# Altium footprint library PcbLib_Discrete_ThroughHole.PcbLib: 104 footprints (part 2 of 7)
Each footprint in its own frame and in the unit in brackets; x right, y up, seen from the top. Pads: shape width x height; smd on the part's side, far side on the other; paste and mask are expansions set on the pad; w line width, h text height; cw(c..) or ccw(c..) is an arc to the next point about the centre after c.
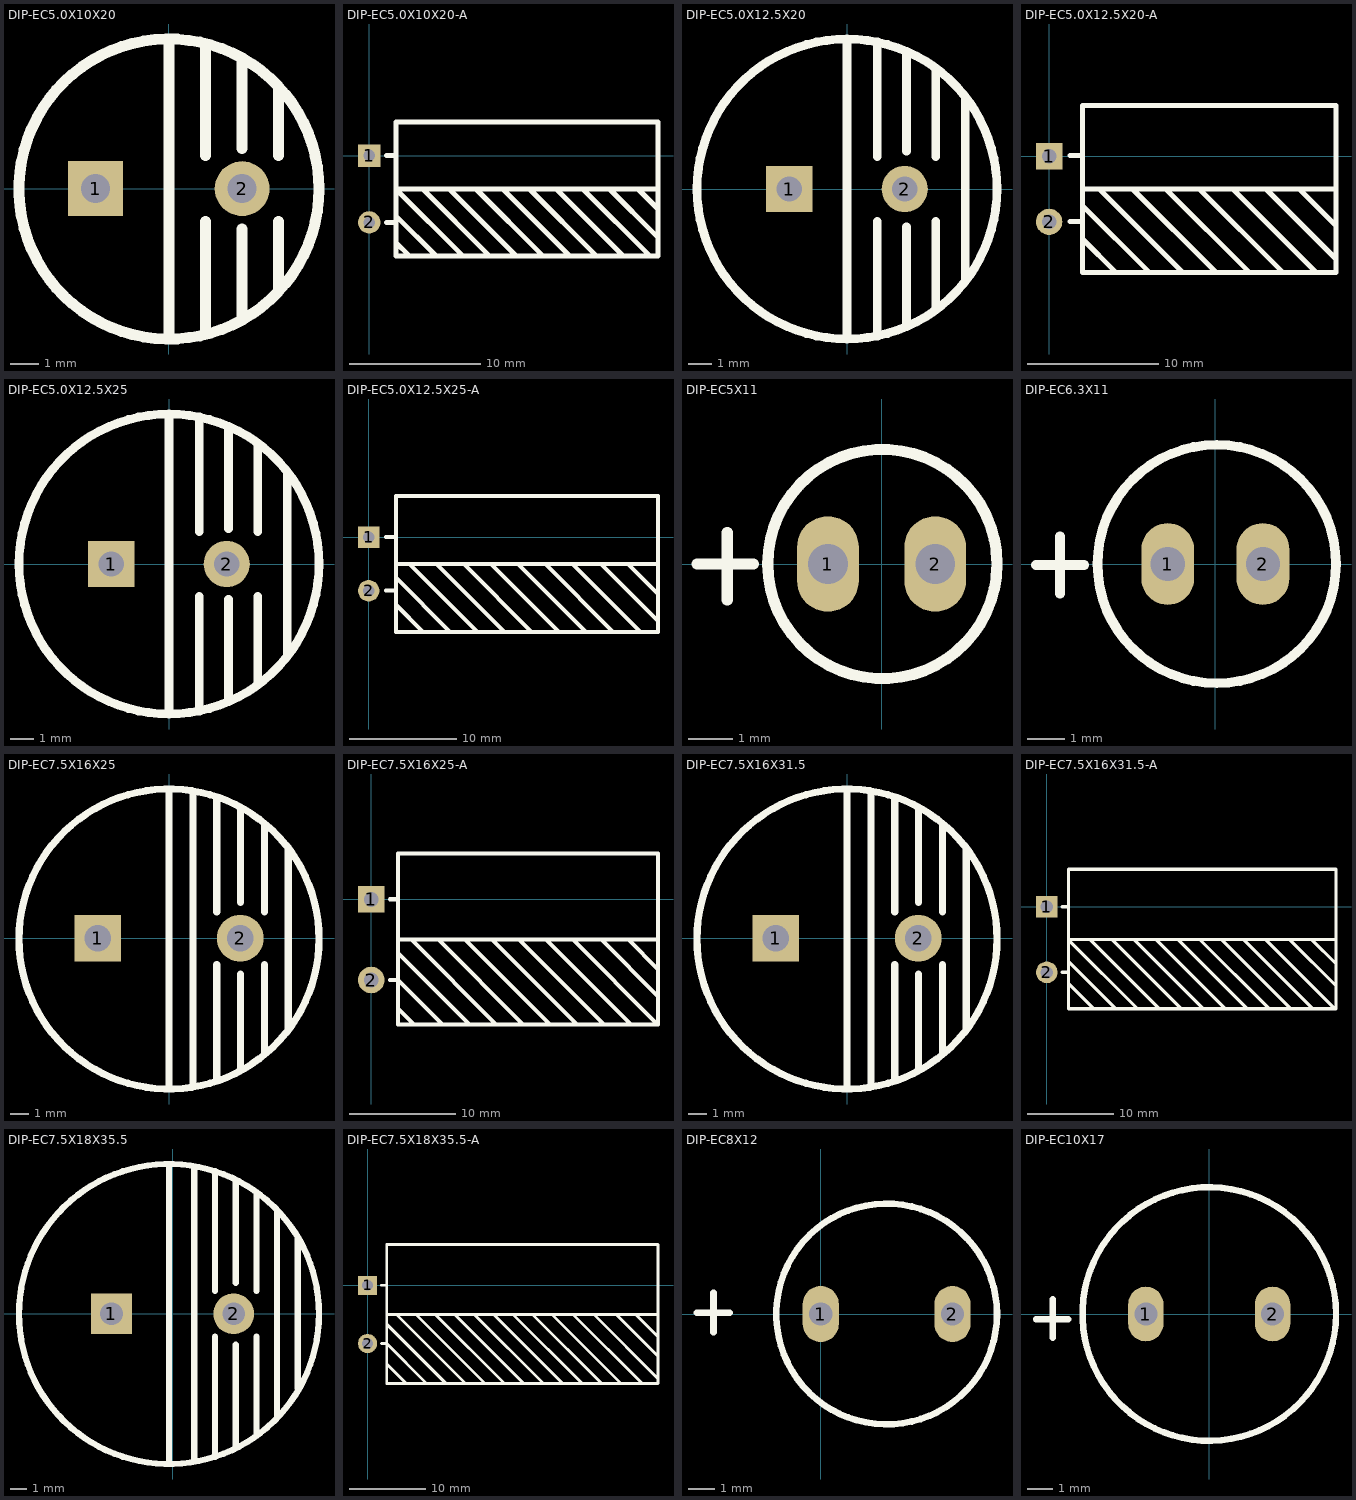
[diagram p1: the footprints below, top view; thin cyan lines are the x and y axes]

## DIP-EC5.0X10X20 [mm]
pads (2):
  rect 1.9x1.9 hole 1: 1(-2.54,0)
  round 1.9 hole 1: 2(2.54,0)
Top Overlay:
  circle w0.381: c0.006,-0.013 r5.2
  lines w0.381: 0.006,-5.197 0.006,5.072 ; 0.006,-5.082 0.006,-5.075 ; 0.006,-4.07 0.006,-4.064 ; 0.006,-3.054 0.006,-3.05 0.006,-3.043 ; 0.006,-2.032 0.006,-2.038 ; 0.006,2.026 0.006,2.032 ; 0.006,4.058 0.006,4.064 ; 0.006,5.074 0.006,5.187 ; 1.27,-4.953 1.27,-1.143 ; 1.27,1.143 1.27,4.953 ; 2.54,-4.445 2.54,-1.397 ; 2.54,1.397 2.54,4.445 ; 3.81,-3.429 3.81,-1.143 ; 3.81,1.143 3.81,3.429 ; 0.006,-2.038 0.006,-2.038
3D body "CAP 5.0X10X20.STEP": height 20.03, standoff -3.38, extent -4.999,-5.062 5.011,4.938

## DIP-EC5.0X10X20-A [mm]
pads (2):
  rect 1.7x1.7 hole 0.9: 1(0,0)
  round 1.7 hole 0.9: 2(0,-5.08)
Top Overlay:
  lines w0.381: 1.321,-5.08 1.778,-5.08 2.032,-5.08 ; 1.321,0 1.778,0 2.032,0 ; 2.032,-6.604 3.048,-7.62 ; 2.032,-4.572 5.08,-7.62 ; 3.81,-2.54 21.971,-2.54 ; 6.096,-2.54 11.176,-7.62 ; 7.112,-7.62 2.032,-2.54 ; 8.128,-2.54 13.208,-7.62 ; 9.144,-7.62 4.064,-2.54 2.54,-2.54 2.032,-2.54 ; 9.652,-2.54 10.16,-2.54 15.24,-7.62 ; 12.192,-2.54 17.272,-7.62 ; 14.224,-2.54 19.304,-7.62 ; 16.256,-2.54 21.336,-7.62 ; 18.288,-2.54 21.844,-6.096 ; 20.32,-2.54 20.447,-2.54 21.971,-4.064 ; 2.032,-2.54 2.032,-2.54 ; 2.032,-7.62 21.971,-7.62 21.971,2.54 2.032,2.54 2.032,-7.62
3D body "CAP 5.0X10X20-H.STEP": height 10.03, standoff -3.47, extent -0.254,-7.545 21.956,2.465

## DIP-EC5.0X12.5X20 [mm]
pads (2):
  rect 2x2 hole 1.1: 1(-2.5,0)
  round 2 hole 1.1: 2(2.5,0)
Top Overlay:
  circle w0.381: c0,0 r6.5
  lines w0.381: 0,-5.842 0,-6.35 0,6.35 ; 0,-5.08 0,-3.81 ; 0,-2.54 0,-1.778 ; 0,1.016 0,2.286 ; 0,3.048 0,4.064 ; 1.31,-6.35 1.31,-1.397 ; 1.31,1.397 1.31,6.35 ; 2.58,-5.842 2.58,-1.651 ; 2.58,1.651 2.58,5.842 ; 3.85,-5.207 3.85,-1.397 ; 3.85,1.397 3.85,5.207 ; 5.12,-3.937 5.12,3.937
3D body "CAP 5.0X12.5X20.STEP": height 20.03, standoff -3.38, extent -6.255,-6.25 6.255,6.25

## DIP-EC5.0X12.5X20-A [mm]
pads (2):
  rect 2x2 hole 1.1: 1(0,0)
  round 2 hole 1.1: 2(0,-5)
Top Overlay:
  lines w0.381: 1.6,-4.96 2.54,-4.96 ; 1.6,0.04 2.54,0.04 ; 2.54,-6.31 5.08,-8.85 ; 2.54,-3.77 7.62,-8.85 ; 2.54,-2.5 21.844,-2.5 ; 3.81,-2.5 10.16,-8.85 ; 6.35,-2.5 12.7,-8.85 ; 8.89,-2.5 15.24,-8.85 ; 11.43,-2.5 17.78,-8.85 ; 13.97,-2.5 20.32,-8.85 ; 16.51,-2.5 21.844,-7.834 ; 19.05,-2.5 21.844,-5.294 ; 2.54,-8.85 2.54,3.85 21.844,3.85 21.844,-8.85 2.54,-8.85
3D body "CAP 5.0X12.5X20-H.STEP": height 12.53, standoff -3.47, extent -0.381,-8.668 21.829,3.842

## DIP-EC5.0X12.5X25 [mm]
pads (2):
  rect 2x2 hole 1.1: 1(-2.5,0)
  round 2 hole 1.1: 2(2.5,0)
Top Overlay:
  circle w0.381: c0,0 r6.5
  lines w0.381: 0,-5.842 0,-6.35 0,6.35 ; 0,-5.08 0,-3.81 ; 0,-2.54 0,-1.778 ; 0,1.016 0,2.286 ; 1.31,-6.35 1.31,-1.397 ; 1.31,1.397 1.31,6.35 ; 2.58,-5.842 2.58,-1.524 ; 2.58,1.524 2.58,5.842 ; 3.85,-5.207 3.85,-1.397 ; 3.85,1.397 3.85,5.207 ; 5.12,-3.937 5.12,3.937
3D body "CAP 5.0X12.5X25.STEP": height 25.04, standoff -3.37, extent -6.255,-6.248 6.255,6.248

## DIP-EC5.0X12.5X25-A [mm]
pads (2):
  rect 2x2 hole 1.1: 1(0,0)
  round 2 hole 1.1: 2(0,-5)
Top Overlay:
  lines w0.381: 1.6,-4.96 2.54,-4.96 ; 1.6,0.04 2.54,0.04 ; 2.54,-6.31 5.08,-8.85 ; 2.54,-3.77 7.62,-8.85 ; 2.54,-2.5 27.051,-2.5 ; 3.81,-2.5 10.16,-8.85 ; 6.35,-2.5 12.7,-8.85 ; 8.89,-2.5 15.24,-8.85 ; 11.43,-2.5 17.78,-8.85 ; 13.97,-2.5 20.32,-8.85 ; 16.51,-2.5 22.86,-8.85 ; 19.05,-2.5 25.4,-8.85 ; 21.717,-2.5 27.051,-7.834 ; 24.257,-2.5 27.051,-5.294 ; 2.54,-8.85 27.051,-8.85 27.051,3.85 2.54,3.85 2.54,-8.85
3D body "CAP 5.0X12.5X25-H.STEP": height 12.53, standoff -3.47, extent -0.381,-8.795 26.829,3.715

## DIP-EC5X11 [mil]
pads (2):
  oval 55x85 hole 35.43: 1(-47.75,0) 2(47.75,0)
Top Overlay:
  circle w10: c0.75,0 r102.02
  lines w10: -164.25,0 -114.25,0 ; -137.25,-32 -137.25,28
3D body "CAP_5×11.STEP": height 491.5, standoff -158.11, extent -107.52,-108.24 109.02,108.24

## DIP-EC6.3X11 [mil]
pads (2):
  oval 55x85 hole 35.43: 1(-49.5,0) 2(49.5,0)
Top Overlay:
  circle w10: c1.5,0 r124.02
  lines w10: -186.5,-1 -136.5,-1 ; -161.5,-31 -161.5,29
3D body "Cap_D63H110.STEP": height 492.13, standoff -118.11, extent -131.36,-133.45 135.21,133.45

## DIP-EC7.5X16X25 [mm]
pads (2):
  rect 2.5x2.5 hole 1.4: 1(-3.8,0)
  round 2.5 hole 1.4: 2(3.8,0)
Top Overlay:
  circle w0.381: c0,-0.038 r8
  lines w0.381: 0,-8.001 0,7.925 ; 1.28,-7.874 1.28,7.747 ; 2.55,-7.493 2.55,-1.397 ; 2.55,1.397 2.55,7.493 ; 3.82,-6.985 3.82,-1.905 ; 3.82,1.905 3.82,6.985 ; 5.09,-6.096 5.09,-1.397 ; 5.09,1.397 5.09,6.096 ; 6.36,-4.826 6.36,4.826
3D body "CAP 7.5X16X25.STEP": height 25.03, standoff -3.38, extent -8.005,-7.998 8.005,7.998

## DIP-EC7.5X16X25-A [mm]
pads (2):
  rect 2.5x2.5 hole 1.4: 1(0,0)
  round 2.5 hole 1.4: 2(0,-7.6)
Top Overlay:
  lines w0.381: 1.778,-7.59 2.502,-7.59 ; 1.778,0.01 2.502,0.01 ; 2.502,-10.277 4.026,-11.801 ; 2.502,-7.61 6.693,-11.801 ; 2.502,-5.07 9.233,-11.801 ; 2.502,-3.8 27.013,-3.8 ; 3.772,-3.8 11.773,-11.801 ; 6.312,-3.8 14.313,-11.801 ; 8.852,-3.8 16.853,-11.801 ; 11.392,-3.8 19.393,-11.801 ; 13.932,-3.8 21.869,-11.738 ; 16.472,-3.8 24.409,-11.738 ; 19.012,-3.8 26.941,-11.729 ; 21.679,-3.8 27.013,-9.134 ; 24.219,-3.8 27.013,-6.594 ; 2.502,-11.801 2.502,4.328 27.013,4.328 27.013,-11.801 2.502,-11.801
3D body "CAP 7.5X16X25-H.STEP": height 16.03, standoff -3.47, extent -0.508,-11.688 26.902,4.322

## DIP-EC7.5X16X31.5 [mm]
pads (2):
  rect 2.5x2.5 hole 1.4: 1(-3.8,0)
  round 2.5 hole 1.4: 2(3.8,0)
Top Overlay:
  circle w0.381: c0,-0.038 r8
  lines w0.381: 0,-8.001 0,7.925 ; 1.28,-7.874 1.28,7.747 ; 2.55,-7.62 2.55,-1.397 ; 2.55,1.397 2.55,7.493 ; 3.82,-6.985 3.82,-1.905 ; 3.82,1.905 3.82,6.985 ; 5.09,-6.096 5.09,-1.397 ; 5.09,1.397 5.09,6.096 ; 6.36,-4.826 6.36,4.699
3D body "CAP 7.5X16X31.5.STEP": height 31.53, standoff -3.38, extent -8.005,-7.999 8.005,7.999

## DIP-EC7.5X16X31.5-A [mm]
pads (2):
  rect 2.5x2.5 hole 1.4: 1(0,0)
  round 2.5 hole 1.4: 2(0,-7.6)
Top Overlay:
  lines w0.381: 1.778,-7.59 2.502,-7.59 ; 1.778,0.01 2.502,0.01 ; 2.502,-8.88 5.423,-11.801 ; 2.502,-6.34 7.963,-11.801 ; 5.042,-3.8 13.043,-11.801 ; 7.582,-3.8 15.519,-11.738 ; 10.122,-3.8 18.059,-11.738 ; 10.503,-11.801 2.502,-3.8 33.49,-3.8 ; 12.662,-3.8 20.599,-11.738 ; 15.202,-3.8 23.139,-11.738 ; 17.742,-3.8 25.679,-11.738 ; 20.282,-3.8 28.219,-11.738 ; 22.822,-3.8 30.759,-11.738 ; 25.362,-3.8 33.291,-11.729 ; 28.156,-3.8 33.49,-9.134 ; 30.696,-3.8 33.49,-6.594 ; 2.502,-11.801 33.49,-11.801 33.49,4.328 2.502,4.328 2.502,-11.801
3D body "CAP 7.5X16X31.5-H.STEP": height 16.03, standoff -3.47, extent -0.508,-11.688 33.402,4.322

## DIP-EC7.5X18X35.5 [mm]
pads (2):
  rect 2.5x2.5 hole 1.4: 1(-3.75,0)
  round 2.5 hole 1.4: 2(3.75,0)
Top Overlay:
  circle w0.381: c-0.218,-0.013 r9.2
  lines w0.381: -0.218,-9.144 -0.218,9.144 ; 1.33,-8.89 1.33,8.89 ; 2.6,-8.636 2.6,-1.397 ; 2.6,1.397 2.6,8.636 ; 3.87,-8.128 3.87,-1.905 ; 3.87,1.905 3.87,8.128 ; 5.14,-7.366 5.14,-1.397 ; 5.14,1.397 5.14,7.366 ; 6.41,-6.35 6.41,6.35 ; 7.68,-4.572 7.68,4.572
3D body "CAP 7.5X18X35.5.STEP": height 35.54, standoff -3.37, extent -9.223,-9 8.787,9

## DIP-EC7.5X18X35.5-A [mm]
pads (2):
  rect 2.5x2.5 hole 1.4: 1(0,0)
  round 2.5 hole 1.4: 2(0,-7.6)
Top Overlay:
  lines w0.381: 1.829,-7.59 2.502,-7.59 ; 1.829,0.01 2.502,0.01 ; 2.502,-10.277 5.013,-12.789 ; 2.502,-7.61 7.697,-12.805 ; 2.502,-5.07 10.227,-12.795 ; 2.502,-3.8 37.942,-3.8 ; 3.772,-3.8 12.727,-12.755 ; 6.312,-3.8 15.287,-12.775 ; 8.852,-3.8 17.817,-12.765 ; 11.392,-3.8 20.377,-12.785 ; 13.932,-3.8 22.907,-12.775 ; 16.472,-3.8 25.437,-12.765 ; 19.012,-3.8 27.997,-12.785 ; 21.552,-3.8 30.527,-12.775 ; 24.092,-3.8 33.057,-12.765 ; 26.842,-3.8 35.812,-12.77 ; 29.582,-3.82 37.922,-12.16 ; 32.559,-3.86 37.893,-9.194 ; 35.099,-3.86 37.893,-6.654 ; 2.502,-12.8 2.502,5.32 37.942,5.32 37.942,-12.8 2.502,-12.8
3D body "CAP 7.5X18X35.5-H.STEP": height 18.03, standoff -3.47, extent -0.508,-12.815 37.902,5.195

## DIP-EC8X12 [mil]
pads (2):
  oval 55x85 hole 35.43: 1(0,0) 2(200,0)
Top Overlay:
  circle w10: c100,0 r167.61
  lines w10: -187.94,2 -137.94,2 ; -162.94,-28 -162.94,32
3D body "CAP_R150_D320_H570(8×14).STEP": height 566.93, standoff -114.17, extent -61.41,-161.42 261.42,161.42

## DIP-EC10X17 [mm]
pads (2):
  oval 1.397x2.159 hole 0.9: 1(-2.5,0) 2(2.5,0)
Top Overlay:
  circle w0.254: c0,0 r5
  lines w0.254: -6.833,-0.203 -5.563,-0.203 ; -6.172,-0.94 -6.172,0.584
3D body "Cap_D80H115.STEP": height 13, standoff -3, extent -4.148,-4.237 4.315,4.237